# Altium schematic symbol library jlcpcb_2025_04_capacitors_extended_0402.schlib: 3594 symbols (part 3 of 20) (continued)
## 0402N330G500CT
designator C?  Capacitance: 33pF  (hidden comment: *)
Capacitor, Ceramic (MLCC), 33pF, ±2%, 50V, NP0, ±2%, SMD 0402; Manufacturer: Walsin Tech Corp; Manufacturer Part Number: 0402N330G500CT; Package Size: 0402; JLCPCB Basic Part: No; JLCPCB Part Number: C424855; Supplier 1: LCSC; Category: Capacitors - MLCC; Supplier Part Number 1: C424855; Tolerance: ±2%; Voltage Rating: 50V; Temperature Coefficient: NP0; RoHS: Yes; ComponentLink1Description: Datasheet; ComponentLink1URL: https://wmsc.lcsc.com/wmsc/upload/file/pdf/v2/lcsc/2304140030_Walsin-Tech-Corp-0402N330G500CT_C424855.pdf; ComponentLink2Description: JLCPCB Part URL; ComponentLink2URL: https://jlcpcb.com/partdetail/C424855; ComponentLink3Description: LCSC Part URL; ComponentLink3URL: https://lcsc.com/product-detail/Multilayer-Ceramic-Capacitors-MLCC---SMD-SMT_Walsin-Tech-Corp-Walsin-Tech-Corp-0402N330G500CT_C424855.html
footprint CAP-0402 (0402 (1005M) Capacitor)
pins: 1, 2

## 0402N330J250CT
designator C?  Capacitance: 33pF  (hidden comment: *)
Capacitor, Ceramic (MLCC), 33pF, ±5%, 25V, NP0, ±5%, SMD 0402; Manufacturer: Walsin Tech Corp; Manufacturer Part Number: 0402N330J250CT; Package Size: 0402; JLCPCB Basic Part: No; JLCPCB Part Number: C458864; Supplier 1: LCSC; Category: Capacitors - MLCC; Supplier Part Number 1: C458864; Tolerance: ±5%; Voltage Rating: 25V; Temperature Coefficient: NP0; RoHS: Yes; ComponentLink1Description: Datasheet; ComponentLink1URL: https://wmsc.lcsc.com/wmsc/upload/file/pdf/v2/lcsc/2304140030_Walsin-Tech-Corp-0402N330J250CT_C458864.pdf; ComponentLink2Description: JLCPCB Part URL; ComponentLink2URL: https://jlcpcb.com/partdetail/C458864; ComponentLink3Description: LCSC Part URL; ComponentLink3URL: https://lcsc.com/product-detail/Multilayer-Ceramic-Capacitors-MLCC---SMD-SMT_Walsin-Tech-Corp-Walsin-Tech-Corp-0402N330J250CT_C458864.html
footprint CAP-0402 (0402 (1005M) Capacitor)
pins: 1, 2

## 0402N330J500CT
designator C?  Capacitance: 33pF  (hidden comment: *)
Capacitor, Ceramic (MLCC), 33pF, ±5%, 50V, NP0, ±5%, SMD 0402; Manufacturer: Walsin Tech Corp; Manufacturer Part Number: 0402N330J500CT; Package Size: 0402; JLCPCB Basic Part: No; JLCPCB Part Number: C338125; Supplier 1: LCSC; Category: Capacitors - MLCC; Supplier Part Number 1: C338125; Tolerance: ±5%; Voltage Rating: 50V; Temperature Coefficient: NP0; RoHS: Yes; ComponentLink1Description: Datasheet; ComponentLink1URL: https://wmsc.lcsc.com/wmsc/upload/file/pdf/v2/lcsc/2304140030_Walsin-Tech-Corp-0402N330J500CT_C338125.pdf; ComponentLink2Description: JLCPCB Part URL; ComponentLink2URL: https://jlcpcb.com/partdetail/C338125; ComponentLink3Description: LCSC Part URL; ComponentLink3URL: https://lcsc.com/product-detail/Multilayer-Ceramic-Capacitors-MLCC---SMD-SMT_Walsin-Tech-Corp-Walsin-Tech-Corp-0402N330J500CT_C338125.html
footprint CAP-0402 (0402 (1005M) Capacitor)
pins: 1, 2

## 0402N330J500CT-C
designator C?  Capacitance: 33pF  (hidden comment: *)
Capacitor, Ceramic (MLCC), 33pF, ±5%, 50V, NP0, ±5%, SMD 0402; Manufacturer: Walsin Tech Corp; Manufacturer Part Number: 0402N330J500CT-C; Package Size: 0402; JLCPCB Basic Part: No; JLCPCB Part Number: C2991421; Supplier 1: LCSC; Category: Capacitors - MLCC; Supplier Part Number 1: C2991421; Tolerance: ±5%; Voltage Rating: 50V; Temperature Coefficient: NP0; RoHS: Yes; ComponentLink1Description: Datasheet; ComponentLink1URL: https://wmsc.lcsc.com/wmsc/upload/file/pdf/v2/lcsc/2204131745_Walsin-Tech-Corp-0402N330J500CT-C_C2991421.pdf; ComponentLink2Description: JLCPCB Part URL; ComponentLink2URL: https://jlcpcb.com/partdetail/C2991421; ComponentLink3Description: LCSC Part URL; ComponentLink3URL: https://lcsc.com/product-detail/Multilayer-Ceramic-Capacitors-MLCC---SMD-SMT_Walsin-Tech-Corp-Walsin-Tech-Corp-0402N330J500CT-C_C2991421.html
footprint CAP-0402 (0402 (1005M) Capacitor)
pins: 1, 2

## 0402N330K250CT
designator C?  Capacitance: 33pF  (hidden comment: *)
Capacitor, Ceramic (MLCC), 33pF, ±10%, 25V, NP0, ±10%, SMD 0402; Manufacturer: Walsin Tech Corp; Manufacturer Part Number: 0402N330K250CT; Package Size: 0402; JLCPCB Basic Part: No; JLCPCB Part Number: C387979; Supplier 1: LCSC; Category: Capacitors - MLCC; Supplier Part Number 1: C387979; Tolerance: ±10%; Voltage Rating: 25V; Temperature Coefficient: NP0; RoHS: Yes; ComponentLink1Description: Datasheet; ComponentLink1URL: https://wmsc.lcsc.com/wmsc/upload/file/pdf/v2/lcsc/2304140030_Walsin-Tech-Corp-0402N330K250CT_C387979.pdf; ComponentLink2Description: JLCPCB Part URL; ComponentLink2URL: https://jlcpcb.com/partdetail/C387979; ComponentLink3Description: LCSC Part URL; ComponentLink3URL: https://lcsc.com/product-detail/Multilayer-Ceramic-Capacitors-MLCC---SMD-SMT_Walsin-Tech-Corp-Walsin-Tech-Corp-0402N330K250CT_C387979.html
footprint CAP-0402 (0402 (1005M) Capacitor)
pins: 1, 2

## 0402N330K500CT
designator C?  Capacitance: 33pF  (hidden comment: *)
Capacitor, Ceramic (MLCC), 33pF, ±10%, 50V, NP0, ±10%, SMD 0402; Manufacturer: Walsin Tech Corp; Manufacturer Part Number: 0402N330K500CT; Package Size: 0402; JLCPCB Basic Part: No; JLCPCB Part Number: C295977; Supplier 1: LCSC; Category: Capacitors - MLCC; Supplier Part Number 1: C295977; Tolerance: ±10%; Voltage Rating: 50V; Temperature Coefficient: NP0; RoHS: Yes; ComponentLink1Description: Datasheet; ComponentLink1URL: https://wmsc.lcsc.com/wmsc/upload/file/pdf/v2/lcsc/2304140030_Walsin-Tech-Corp-0402N330K500CT_C295977.pdf; ComponentLink2Description: JLCPCB Part URL; ComponentLink2URL: https://jlcpcb.com/partdetail/C295977; ComponentLink3Description: LCSC Part URL; ComponentLink3URL: https://lcsc.com/product-detail/Multilayer-Ceramic-Capacitors-MLCC---SMD-SMT_Walsin-Tech-Corp-Walsin-Tech-Corp-0402N330K500CT_C295977.html
footprint CAP-0402 (0402 (1005M) Capacitor)
pins: 1, 2

## 0402N331J500CT
designator C?  Capacitance: 330pF  (hidden comment: *)
Capacitor, Ceramic (MLCC), 330pF, ±5%, 50V, NP0, ±5%, SMD 0402; Manufacturer: Walsin Tech Corp; Manufacturer Part Number: 0402N331J500CT; Package Size: 0402; JLCPCB Basic Part: No; JLCPCB Part Number: C301980; Supplier 1: LCSC; Category: Capacitors - MLCC; Supplier Part Number 1: C301980; Tolerance: ±5%; Voltage Rating: 50V; Temperature Coefficient: NP0; RoHS: Yes; ComponentLink1Description: Datasheet; ComponentLink1URL: https://wmsc.lcsc.com/wmsc/upload/file/pdf/v2/lcsc/2304140030_Walsin-Tech-Corp-0402N331J500CT_C301980.pdf; ComponentLink2Description: JLCPCB Part URL; ComponentLink2URL: https://jlcpcb.com/partdetail/C301980; ComponentLink3Description: LCSC Part URL; ComponentLink3URL: https://lcsc.com/product-detail/Multilayer-Ceramic-Capacitors-MLCC---SMD-SMT_Walsin-Tech-Corp-Walsin-Tech-Corp-0402N331J500CT_C301980.html
footprint CAP-0402 (0402 (1005M) Capacitor)
pins: 1, 2

## 0402N360J500CT
designator C?  Capacitance: 36pF  (hidden comment: *)
Capacitor, Ceramic (MLCC), 36pF, ±5%, 50V, NP0, ±5%, SMD 0402; Manufacturer: Walsin Tech Corp; Manufacturer Part Number: 0402N360J500CT; Package Size: 0402; JLCPCB Basic Part: No; JLCPCB Part Number: C295978; Supplier 1: LCSC; Category: Capacitors - MLCC; Supplier Part Number 1: C295978; Tolerance: ±5%; Voltage Rating: 50V; Temperature Coefficient: NP0; RoHS: Yes; ComponentLink1Description: Datasheet; ComponentLink1URL: https://wmsc.lcsc.com/wmsc/upload/file/pdf/v2/lcsc/2304140030_Walsin-Tech-Corp-0402N360J500CT_C295978.pdf; ComponentLink2Description: JLCPCB Part URL; ComponentLink2URL: https://jlcpcb.com/partdetail/C295978; ComponentLink3Description: LCSC Part URL; ComponentLink3URL: https://lcsc.com/product-detail/Multilayer-Ceramic-Capacitors-MLCC---SMD-SMT_Walsin-Tech-Corp-Walsin-Tech-Corp-0402N360J500CT_C295978.html
footprint CAP-0402 (0402 (1005M) Capacitor)
pins: 1, 2

## 0402N390F500CT
designator C?  Capacitance: 39pF  (hidden comment: *)
Capacitor, Ceramic (MLCC), 39pF, ±1%, 50V, NP0, ±1%, SMD 0402; Manufacturer: Walsin Tech Corp; Manufacturer Part Number: 0402N390F500CT; Package Size: 0402; JLCPCB Basic Part: No; JLCPCB Part Number: C295979; Supplier 1: LCSC; Category: Capacitors - MLCC; Supplier Part Number 1: C295979; Tolerance: ±1%; Voltage Rating: 50V; Temperature Coefficient: NP0; RoHS: Yes; ComponentLink1Description: Datasheet; ComponentLink1URL: https://wmsc.lcsc.com/wmsc/upload/file/pdf/v2/lcsc/2304140030_Walsin-Tech-Corp-0402N390F500CT_C295979.pdf; ComponentLink2Description: JLCPCB Part URL; ComponentLink2URL: https://jlcpcb.com/partdetail/C295979; ComponentLink3Description: LCSC Part URL; ComponentLink3URL: https://lcsc.com/product-detail/Multilayer-Ceramic-Capacitors-MLCC---SMD-SMT_Walsin-Tech-Corp-Walsin-Tech-Corp-0402N390F500CT_C295979.html
footprint CAP-0402 (0402 (1005M) Capacitor)
pins: 1, 2

## 0402N390G500CT-C
designator C?  Capacitance: 39pF  (hidden comment: *)
Capacitor, Ceramic (MLCC), 39pF, ±2%, 50V, NP0, ±2%, SMD 0402; Manufacturer: Walsin Tech Corp; Manufacturer Part Number: 0402N390G500CT-C; Package Size: 0402; JLCPCB Basic Part: No; JLCPCB Part Number: C2991465; Supplier 1: LCSC; Category: Capacitors - MLCC; Supplier Part Number 1: C2991465; Tolerance: ±2%; Voltage Rating: 50V; Temperature Coefficient: NP0; RoHS: Yes; ComponentLink1Description: Datasheet; ComponentLink1URL: https://wmsc.lcsc.com/wmsc/upload/file/pdf/v2/lcsc/2204131745_Walsin-Tech-Corp-0402N390G500CT-C_C2991465.pdf; ComponentLink2Description: JLCPCB Part URL; ComponentLink2URL: https://jlcpcb.com/partdetail/C2991465; ComponentLink3Description: LCSC Part URL; ComponentLink3URL: https://lcsc.com/product-detail/Multilayer-Ceramic-Capacitors-MLCC---SMD-SMT_Walsin-Tech-Corp-Walsin-Tech-Corp-0402N390G500CT-C_C2991465.html
footprint CAP-0402 (0402 (1005M) Capacitor)
pins: 1, 2

## 0402N390J500CT
designator C?  Capacitance: 39pF  (hidden comment: *)
Capacitor, Ceramic (MLCC), 39pF, ±5%, 50V, NP0, ±5%, SMD 0402; Manufacturer: Walsin Tech Corp; Manufacturer Part Number: 0402N390J500CT; Package Size: 0402; JLCPCB Basic Part: No; JLCPCB Part Number: C301981; Supplier 1: LCSC; Category: Capacitors - MLCC; Supplier Part Number 1: C301981; Tolerance: ±5%; Voltage Rating: 50V; Temperature Coefficient: NP0; RoHS: Yes; ComponentLink1Description: Datasheet; ComponentLink1URL: https://wmsc.lcsc.com/wmsc/upload/file/pdf/v2/lcsc/2304140030_Walsin-Tech-Corp-0402N390J500CT_C301981.pdf; ComponentLink2Description: JLCPCB Part URL; ComponentLink2URL: https://jlcpcb.com/partdetail/C301981; ComponentLink3Description: LCSC Part URL; ComponentLink3URL: https://lcsc.com/product-detail/Multilayer-Ceramic-Capacitors-MLCC---SMD-SMT_Walsin-Tech-Corp-Walsin-Tech-Corp-0402N390J500CT_C301981.html
footprint CAP-0402 (0402 (1005M) Capacitor)
pins: 1, 2

## 0402N390K500CT
designator C?  Capacitance: 39pF  (hidden comment: *)
Capacitor, Ceramic (MLCC), 39pF, ±10%, 50V, NP0, ±10%, SMD 0402; Manufacturer: Walsin Tech Corp; Manufacturer Part Number: 0402N390K500CT; Package Size: 0402; JLCPCB Basic Part: No; JLCPCB Part Number: C295980; Supplier 1: LCSC; Category: Capacitors - MLCC; Supplier Part Number 1: C295980; Tolerance: ±10%; Voltage Rating: 50V; Temperature Coefficient: NP0; RoHS: Yes; ComponentLink1Description: Datasheet; ComponentLink1URL: https://wmsc.lcsc.com/wmsc/upload/file/pdf/v2/lcsc/2304140030_Walsin-Tech-Corp-0402N390K500CT_C295980.pdf; ComponentLink2Description: JLCPCB Part URL; ComponentLink2URL: https://jlcpcb.com/partdetail/C295980; ComponentLink3Description: LCSC Part URL; ComponentLink3URL: https://lcsc.com/product-detail/Multilayer-Ceramic-Capacitors-MLCC---SMD-SMT_Walsin-Tech-Corp-Walsin-Tech-Corp-0402N390K500CT_C295980.html
footprint CAP-0402 (0402 (1005M) Capacitor)
pins: 1, 2

## 0402N430J500CT
designator C?  Capacitance: 43pF  (hidden comment: *)
Capacitor, Ceramic (MLCC), 43pF, ±5%, 50V, NP0, ±5%, SMD 0402; Manufacturer: Walsin Tech Corp; Manufacturer Part Number: 0402N430J500CT; Package Size: 0402; JLCPCB Basic Part: No; JLCPCB Part Number: C301982; Supplier 1: LCSC; Category: Capacitors - MLCC; Supplier Part Number 1: C301982; Tolerance: ±5%; Voltage Rating: 50V; Temperature Coefficient: NP0; RoHS: Yes; ComponentLink1Description: Datasheet; ComponentLink1URL: https://wmsc.lcsc.com/wmsc/upload/file/pdf/v2/lcsc/2304140030_Walsin-Tech-Corp-0402N430J500CT_C301982.pdf; ComponentLink2Description: JLCPCB Part URL; ComponentLink2URL: https://jlcpcb.com/partdetail/C301982; ComponentLink3Description: LCSC Part URL; ComponentLink3URL: https://lcsc.com/product-detail/Multilayer-Ceramic-Capacitors-MLCC---SMD-SMT_Walsin-Tech-Corp-Walsin-Tech-Corp-0402N430J500CT_C301982.html
footprint CAP-0402 (0402 (1005M) Capacitor)
pins: 1, 2

## 0402N430K500CT
designator C?  Capacitance: 43pF  (hidden comment: *)
Capacitor, Ceramic (MLCC), 43pF, ±10%, 50V, NP0, ±10%, SMD 0402; Manufacturer: Walsin Tech Corp; Manufacturer Part Number: 0402N430K500CT; Package Size: 0402; JLCPCB Basic Part: No; JLCPCB Part Number: C295983; Supplier 1: LCSC; Category: Capacitors - MLCC; Supplier Part Number 1: C295983; Tolerance: ±10%; Voltage Rating: 50V; Temperature Coefficient: NP0; RoHS: Yes; ComponentLink1Description: Datasheet; ComponentLink1URL: https://wmsc.lcsc.com/wmsc/upload/file/pdf/v2/lcsc/2304140030_Walsin-Tech-Corp-0402N430K500CT_C295983.pdf; ComponentLink2Description: JLCPCB Part URL; ComponentLink2URL: https://jlcpcb.com/partdetail/C295983; ComponentLink3Description: LCSC Part URL; ComponentLink3URL: https://lcsc.com/product-detail/Multilayer-Ceramic-Capacitors-MLCC---SMD-SMT_Walsin-Tech-Corp-Walsin-Tech-Corp-0402N430K500CT_C295983.html
footprint CAP-0402 (0402 (1005M) Capacitor)
pins: 1, 2

## 0402N431J500CT
designator C?  Capacitance: 430pF  (hidden comment: *)
Capacitor, Ceramic (MLCC), 430pF, ±5%, 50V, NP0, ±5%, SMD 0402; Manufacturer: Walsin Tech Corp; Manufacturer Part Number: 0402N431J500CT; Package Size: 0402; JLCPCB Basic Part: No; JLCPCB Part Number: C458865; Supplier 1: LCSC; Category: Capacitors - MLCC; Supplier Part Number 1: C458865; Tolerance: ±5%; Voltage Rating: 50V; Temperature Coefficient: NP0; RoHS: Yes; ComponentLink1Description: Datasheet; ComponentLink1URL: https://wmsc.lcsc.com/wmsc/upload/file/pdf/v2/lcsc/2304140030_Walsin-Tech-Corp-0402N431J500CT_C458865.pdf; ComponentLink2Description: JLCPCB Part URL; ComponentLink2URL: https://jlcpcb.com/partdetail/C458865; ComponentLink3Description: LCSC Part URL; ComponentLink3URL: https://lcsc.com/product-detail/Multilayer-Ceramic-Capacitors-MLCC---SMD-SMT_Walsin-Tech-Corp-Walsin-Tech-Corp-0402N431J500CT_C458865.html
footprint CAP-0402 (0402 (1005M) Capacitor)
pins: 1, 2

## 0402N470F500CT
designator C?  Capacitance: 47pF  (hidden comment: *)
Capacitor, Ceramic (MLCC), 47pF, ±1%, 50V, NP0, ±1%, SMD 0402; Manufacturer: Walsin Tech Corp; Manufacturer Part Number: 0402N470F500CT; Package Size: 0402; JLCPCB Basic Part: No; JLCPCB Part Number: C384800; Supplier 1: LCSC; Category: Capacitors - MLCC; Supplier Part Number 1: C384800; Tolerance: ±1%; Voltage Rating: 50V; Temperature Coefficient: NP0; RoHS: Yes; ComponentLink1Description: Datasheet; ComponentLink1URL: https://wmsc.lcsc.com/wmsc/upload/file/pdf/v2/lcsc/2304140030_Walsin-Tech-Corp-0402N470F500CT_C384800.pdf; ComponentLink2Description: JLCPCB Part URL; ComponentLink2URL: https://jlcpcb.com/partdetail/C384800; ComponentLink3Description: LCSC Part URL; ComponentLink3URL: https://lcsc.com/product-detail/Multilayer-Ceramic-Capacitors-MLCC---SMD-SMT_Walsin-Tech-Corp-Walsin-Tech-Corp-0402N470F500CT_C384800.html
footprint CAP-0402 (0402 (1005M) Capacitor)
pins: 1, 2

## 0402N470G500CT
designator C?  Capacitance: 47pF  (hidden comment: *)
Capacitor, Ceramic (MLCC), 47pF, ±2%, 50V, NP0, ±2%, SMD 0402; Manufacturer: Walsin Tech Corp; Manufacturer Part Number: 0402N470G500CT; Package Size: 0402; JLCPCB Basic Part: No; JLCPCB Part Number: C295984; Supplier 1: LCSC; Category: Capacitors - MLCC; Supplier Part Number 1: C295984; Tolerance: ±2%; Voltage Rating: 50V; Temperature Coefficient: NP0; RoHS: Yes; ComponentLink1Description: Datasheet; ComponentLink1URL: https://wmsc.lcsc.com/wmsc/upload/file/pdf/v2/lcsc/2304140030_Walsin-Tech-Corp-0402N470G500CT_C295984.pdf; ComponentLink2Description: JLCPCB Part URL; ComponentLink2URL: https://jlcpcb.com/partdetail/C295984; ComponentLink3Description: LCSC Part URL; ComponentLink3URL: https://lcsc.com/product-detail/Multilayer-Ceramic-Capacitors-MLCC---SMD-SMT_Walsin-Tech-Corp-Walsin-Tech-Corp-0402N470G500CT_C295984.html
footprint CAP-0402 (0402 (1005M) Capacitor)
pins: 1, 2

## 0402N470J101CT
designator C?  Capacitance: 47pF  (hidden comment: *)
Capacitor, Ceramic (MLCC), 47pF, ±5%, 100V, C0G, ±5%, SMD 0402; Manufacturer: Walsin Tech Corp; Manufacturer Part Number: 0402N470J101CT; Package Size: 0402; JLCPCB Basic Part: No; JLCPCB Part Number: C3863531; Supplier 1: LCSC; Category: Capacitors - MLCC; Supplier Part Number 1: C3863531; Tolerance: ±5%; Voltage Rating: 100V; Temperature Coefficient: C0G; RoHS: Yes; ComponentLink1Description: Datasheet; ComponentLink1URL: https://wmsc.lcsc.com/wmsc/upload/file/pdf/v2/lcsc/2309201534_Walsin-Tech-Corp-0402N470J101CT_C3863531.pdf; ComponentLink2Description: JLCPCB Part URL; ComponentLink2URL: https://jlcpcb.com/partdetail/C3863531; ComponentLink3Description: LCSC Part URL; ComponentLink3URL: https://lcsc.com/product-detail/Multilayer-Ceramic-Capacitors-MLCC---SMD-SMT_Walsin-Tech-Corp-Walsin-Tech-Corp-0402N470J101CT_C3863531.html
footprint CAP-0402 (0402 (1005M) Capacitor)
pins: 1, 2

## 0402N470J500CT
designator C?  Capacitance: 47pF  (hidden comment: *)
Capacitor, Ceramic (MLCC), 47pF, ±5%, 50V, NP0, ±5%, SMD 0402; Manufacturer: Walsin Tech Corp; Manufacturer Part Number: 0402N470J500CT; Package Size: 0402; JLCPCB Basic Part: No; JLCPCB Part Number: C338134; Supplier 1: LCSC; Category: Capacitors - MLCC; Supplier Part Number 1: C338134; Tolerance: ±5%; Voltage Rating: 50V; Temperature Coefficient: NP0; RoHS: Yes; ComponentLink1Description: Datasheet; ComponentLink1URL: https://wmsc.lcsc.com/wmsc/upload/file/pdf/v2/lcsc/2304140030_Walsin-Tech-Corp-0402N470J500CT_C338134.pdf; ComponentLink2Description: JLCPCB Part URL; ComponentLink2URL: https://jlcpcb.com/partdetail/C338134; ComponentLink3Description: LCSC Part URL; ComponentLink3URL: https://lcsc.com/product-detail/Multilayer-Ceramic-Capacitors-MLCC---SMD-SMT_Walsin-Tech-Corp-Walsin-Tech-Corp-0402N470J500CT_C338134.html
footprint CAP-0402 (0402 (1005M) Capacitor)
pins: 1, 2

## 0402N470K500CT
designator C?  Capacitance: 47pF  (hidden comment: *)
Capacitor, Ceramic (MLCC), 47pF, ±10%, 50V, NP0, ±10%, SMD 0402; Manufacturer: Walsin Tech Corp; Manufacturer Part Number: 0402N470K500CT; Package Size: 0402; JLCPCB Basic Part: No; JLCPCB Part Number: C295985; Supplier 1: LCSC; Category: Capacitors - MLCC; Supplier Part Number 1: C295985; Tolerance: ±10%; Voltage Rating: 50V; Temperature Coefficient: NP0; RoHS: Yes; ComponentLink1Description: Datasheet; ComponentLink1URL: https://wmsc.lcsc.com/wmsc/upload/file/pdf/v2/lcsc/2304140030_Walsin-Tech-Corp-0402N470K500CT_C295985.pdf; ComponentLink2Description: JLCPCB Part URL; ComponentLink2URL: https://jlcpcb.com/partdetail/C295985; ComponentLink3Description: LCSC Part URL; ComponentLink3URL: https://lcsc.com/product-detail/Multilayer-Ceramic-Capacitors-MLCC---SMD-SMT_Walsin-Tech-Corp-Walsin-Tech-Corp-0402N470K500CT_C295985.html
footprint CAP-0402 (0402 (1005M) Capacitor)
pins: 1, 2

## 0402N471F500CT
designator C?  Capacitance: 470pF  (hidden comment: *)
Capacitor, Ceramic (MLCC), 470pF, ±1%, 50V, NP0, ±1%, SMD 0402; Manufacturer: Walsin Tech Corp; Manufacturer Part Number: 0402N471F500CT; Package Size: 0402; JLCPCB Basic Part: No; JLCPCB Part Number: C880765; Supplier 1: LCSC; Category: Capacitors - MLCC; Supplier Part Number 1: C880765; Tolerance: ±1%; Voltage Rating: 50V; Temperature Coefficient: NP0; RoHS: Yes; ComponentLink1Description: Datasheet; ComponentLink1URL: https://wmsc.lcsc.com/wmsc/upload/file/pdf/v2/lcsc/2304140030_Walsin-Tech-Corp-0402N471F500CT_C880765.pdf; ComponentLink2Description: JLCPCB Part URL; ComponentLink2URL: https://jlcpcb.com/partdetail/C880765; ComponentLink3Description: LCSC Part URL; ComponentLink3URL: https://lcsc.com/product-detail/Multilayer-Ceramic-Capacitors-MLCC---SMD-SMT_Walsin-Tech-Corp-Walsin-Tech-Corp-0402N471F500CT_C880765.html
footprint CAP-0402 (0402 (1005M) Capacitor)
pins: 1, 2

## 0402N471G500CT
designator C?  Capacitance: 470pF  (hidden comment: *)
Capacitor, Ceramic (MLCC), 470pF, ±2%, 50V, NP0, ±2%, SMD 0402; Manufacturer: Walsin Tech Corp; Manufacturer Part Number: 0402N471G500CT; Package Size: 0402; JLCPCB Basic Part: No; JLCPCB Part Number: C123488; Supplier 1: LCSC; Category: Capacitors - MLCC; Supplier Part Number 1: C123488; Tolerance: ±2%; Voltage Rating: 50V; Temperature Coefficient: NP0; RoHS: Yes; ComponentLink1Description: Datasheet; ComponentLink1URL: https://wmsc.lcsc.com/wmsc/upload/file/pdf/v2/lcsc/2304140030_Walsin-Tech-Corp-0402N471G500CT_C123488.pdf; ComponentLink2Description: JLCPCB Part URL; ComponentLink2URL: https://jlcpcb.com/partdetail/C123488; ComponentLink3Description: LCSC Part URL; ComponentLink3URL: https://lcsc.com/product-detail/Multilayer-Ceramic-Capacitors-MLCC---SMD-SMT_Walsin-Tech-Corp-Walsin-Tech-Corp-0402N471G500CT_C123488.html
footprint CAP-0402 (0402 (1005M) Capacitor)
pins: 1, 2

## 0402N471J250CT
designator C?  Capacitance: 470pF  (hidden comment: *)
Capacitor, Ceramic (MLCC), 470pF, ±5%, 25V, NP0, ±5%, SMD 0402; Manufacturer: Walsin Tech Corp; Manufacturer Part Number: 0402N471J250CT; Package Size: 0402; JLCPCB Basic Part: No; JLCPCB Part Number: C424858; Supplier 1: LCSC; Category: Capacitors - MLCC; Supplier Part Number 1: C424858; Tolerance: ±5%; Voltage Rating: 25V; Temperature Coefficient: NP0; RoHS: Yes; ComponentLink1Description: Datasheet; ComponentLink1URL: https://wmsc.lcsc.com/wmsc/upload/file/pdf/v2/lcsc/2304140030_Walsin-Tech-Corp-0402N471J250CT_C424858.pdf; ComponentLink2Description: JLCPCB Part URL; ComponentLink2URL: https://jlcpcb.com/partdetail/C424858; ComponentLink3Description: LCSC Part URL; ComponentLink3URL: https://lcsc.com/product-detail/Multilayer-Ceramic-Capacitors-MLCC---SMD-SMT_Walsin-Tech-Corp-Walsin-Tech-Corp-0402N471J250CT_C424858.html
footprint CAP-0402 (0402 (1005M) Capacitor)
pins: 1, 2

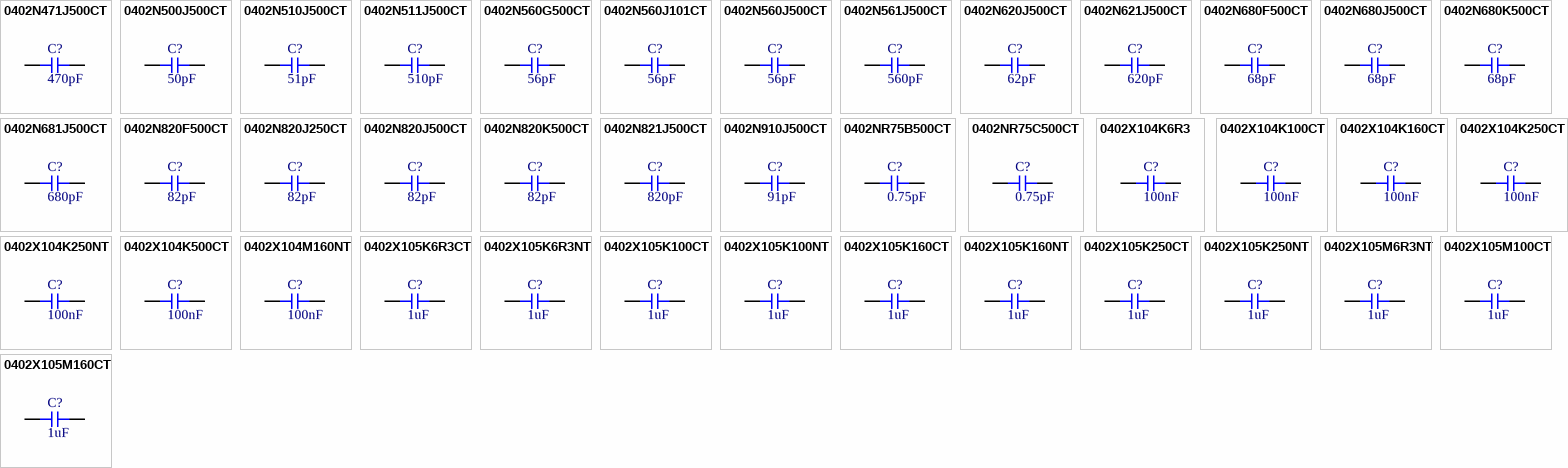
[diagram p13: symbols 0402N471J500CT to 0402X105M160CT]

## 0402N471J500CT
designator C?  Capacitance: 470pF  (hidden comment: *)
Capacitor, Ceramic (MLCC), 470pF, ±5%, 50V, NP0, ±5%, SMD 0402; Manufacturer: Walsin Tech Corp; Manufacturer Part Number: 0402N471J500CT; Package Size: 0402; JLCPCB Basic Part: No; JLCPCB Part Number: C295986; Supplier 1: LCSC; Category: Capacitors - MLCC; Supplier Part Number 1: C295986; Tolerance: ±5%; Voltage Rating: 50V; Temperature Coefficient: NP0; RoHS: Yes; ComponentLink1Description: Datasheet; ComponentLink1URL: https://wmsc.lcsc.com/wmsc/upload/file/pdf/v2/lcsc/2304140030_Walsin-Tech-Corp-0402N471J500CT_C295986.pdf; ComponentLink2Description: JLCPCB Part URL; ComponentLink2URL: https://jlcpcb.com/partdetail/C295986; ComponentLink3Description: LCSC Part URL; ComponentLink3URL: https://lcsc.com/product-detail/Multilayer-Ceramic-Capacitors-MLCC---SMD-SMT_Walsin-Tech-Corp-Walsin-Tech-Corp-0402N471J500CT_C295986.html
footprint CAP-0402 (0402 (1005M) Capacitor)
pins: 1, 2
